# Altium footprint library PCB贴片元件封装库.pcblib: 366 footprints (part 9 of 23)
Each footprint in its own frame and in the unit in brackets; x right, y up, seen from the top. Pads: shape width x height; smd on the part's side, far side on the other; paste and mask are expansions set on the pad; w line width, h text height; cw(c..) or ccw(c..) is an arc to the next point about the centre after c.
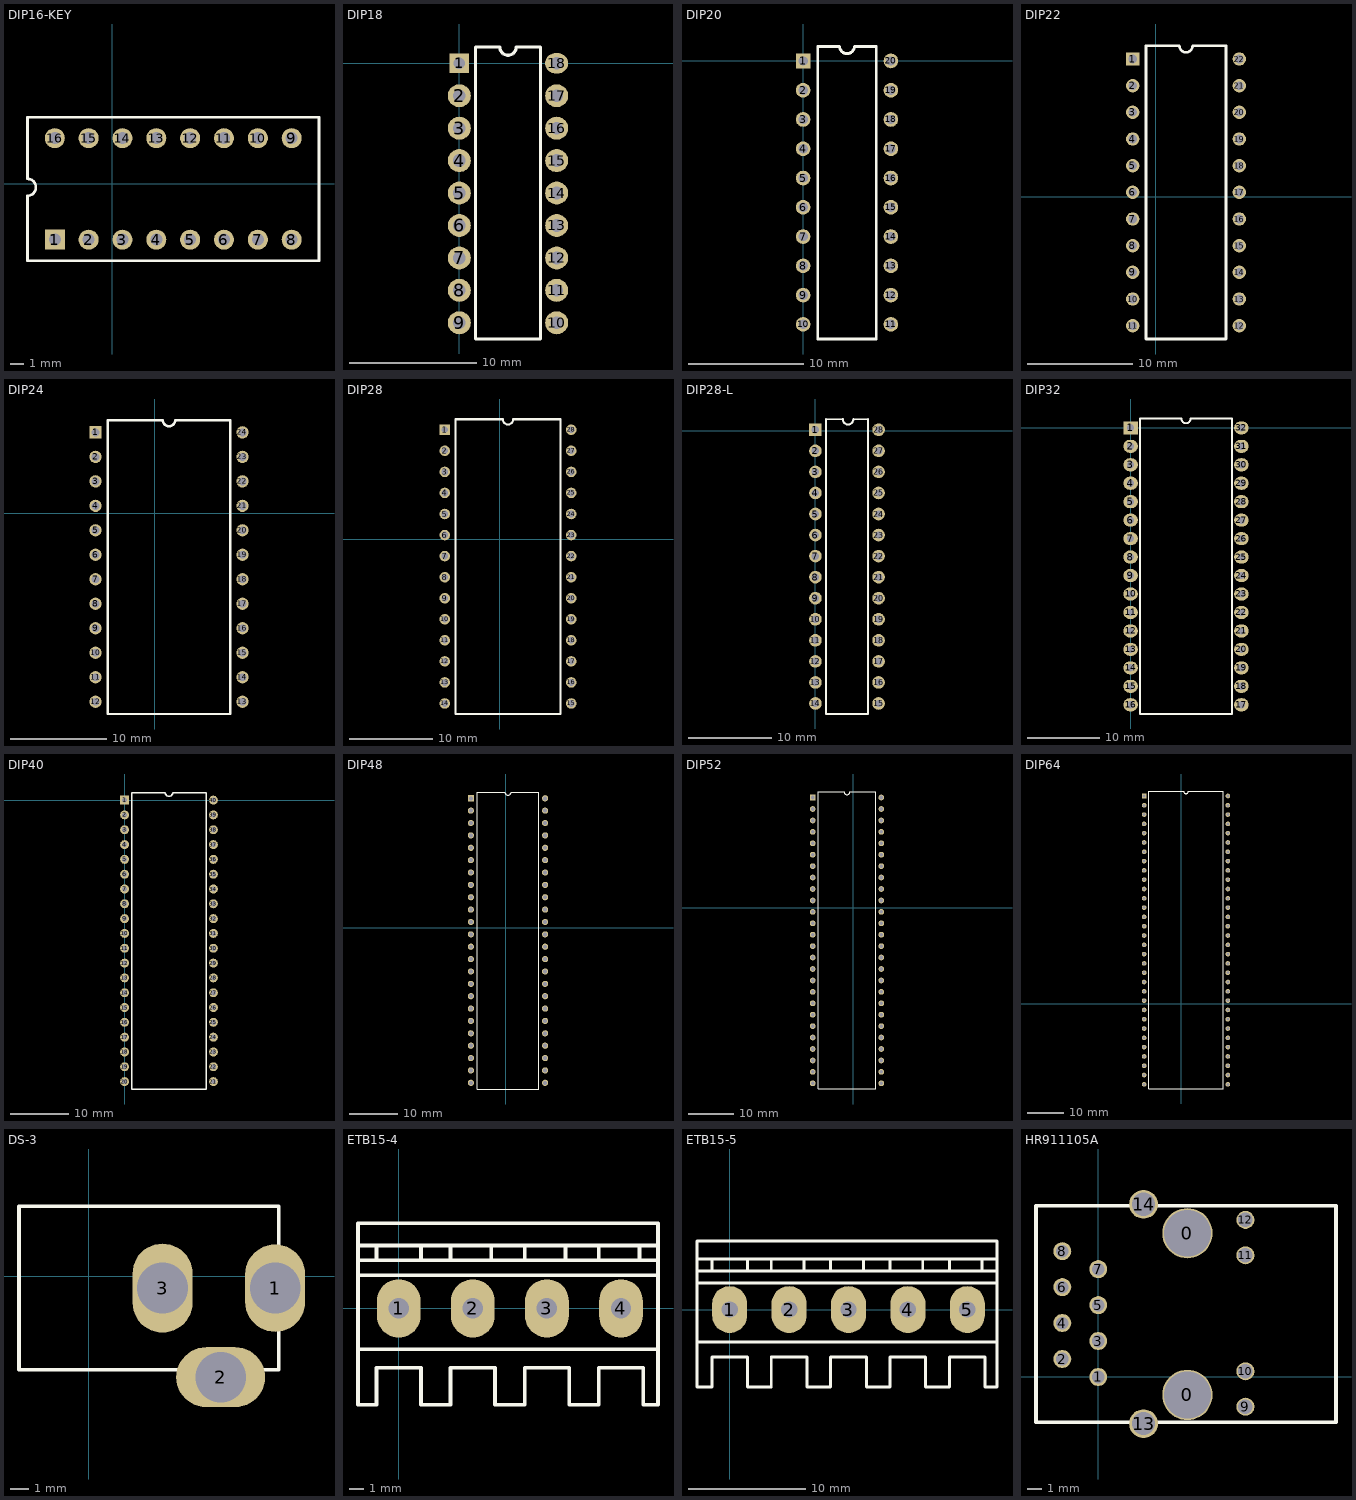
[diagram p8: the footprints below, top view; thin cyan lines are the x and y axes]

## DIP16-KEY [mm]
pads (16):
  rect 1.5x1.5 hole 0.9: 1(-4.318,-4.191)
  round 1.5 hole 0.9: 2(-1.778,-4.191) 3(0.762,-4.191) 4(3.302,-4.191) 5(5.842,-4.191) 6(8.382,-4.191) 7(10.922,-4.191) 8(13.462,-4.191) 9(13.462,3.429) 10(10.922,3.429) 11(8.382,3.429) 12(5.842,3.429) 13(3.302,3.429) 14(0.762,3.429) 15(-1.778,3.429) 16(-4.318,3.429)
TopOverlay:
  lines w0.2: -6.368,0.379 cw(c-6.368,-0.256) -6.368,-0.891 -6.368,-5.781 15.512,-5.781 15.512,5.009 -6.368,5.009 -6.368,0.409

## DIP18 [mm]
pads (18):
  rect 1.524x1.524 hole 0.889: 1(0,0)
  round 1.8 hole 1: 2(0,-2.54) 3(0,-5.08) 4(0,-7.62) 5(0,-10.16) 6(0,-12.7) 7(0,-15.24) 8(0,-17.78) 9(0,-20.32) 10(7.62,-20.32) 11(7.62,-17.78) 12(7.62,-15.24) 13(7.62,-12.7) 14(7.62,-10.16) 15(7.62,-7.62) 16(7.62,-5.08) 17(7.62,-2.54)
  oval 1.8x1.6 hole 1: 18(7.62,0)
TopOverlay:
  lines w0.254: 1.27,-21.59 1.27,1.27 3.175,1.27 ccw(c3.81,1.27) 4.445,1.27 6.35,1.27 6.35,-21.59 1.27,-21.59

## DIP20 [mil]
pads (20):
  rect 50x50 hole 32: 1(0,0)
  round 50 hole 32: 2(0,-100) 3(0,-200) 4(0,-300) 5(0,-400) 6(0,-500) 7(0,-600) 8(0,-700) 9(0,-800) 10(0,-900) 11(300,-900) 12(300,-800) 13(300,-700) 14(300,-600) 15(300,-500) 16(300,-400) 17(300,-300) 18(300,-200) 19(300,-100) 20(300,0)
TopOverlay:
  lines w10: 50,-950 50,50 125,50 ccw(c150,50) 175,50 250,50 250,-950 50,-950

## DIP22 [mil]
pads (22):
  rect 50x50 hole 32: 1(-85.94,517.05)
  round 50 hole 32: 2(-85.94,417.05) 3(-85.94,317.05) 4(-85.94,217.05) 5(-85.94,117.05) 6(-85.94,17.05) 7(-85.94,-82.95) 8(-85.94,-182.95) 9(-85.94,-282.95) 10(-85.94,-382.95) 11(-85.94,-482.95) 12(314.06,-482.95) 13(314.06,-382.95) 14(314.06,-282.95) 15(314.06,-182.95) 16(314.06,-82.95) 17(314.06,17.05) 18(314.06,117.05) 19(314.06,217.05) 20(314.06,317.05) 21(314.06,417.05) 22(314.06,517.05)
TopOverlay:
  lines w10: -35.94,-532.95 -35.94,567.05 89.06,567.05 ccw(c114.06,567.05) 139.06,567.05 264.06,567.05 264.06,-532.95 -35.94,-532.95

## DIP24 [mil]
pads (24):
  rect 50x50 hole 32: 1(-242.52,330.2)
  round 50 hole 32: 2(-242.52,230.2) 3(-242.52,130.2) 4(-242.52,30.2) 5(-242.52,-69.8) 6(-242.52,-169.8) 7(-242.52,-269.8) 8(-242.52,-369.8) 9(-242.52,-469.8) 10(-242.52,-569.8) 11(-242.52,-669.8) 12(-242.52,-769.8) 13(357.48,-769.8) 14(357.48,-669.8) 15(357.48,-569.8) 16(357.48,-469.8) 17(357.48,-369.8) 18(357.48,-269.8) 19(357.48,-169.8) 20(357.48,-69.8) 21(357.48,30.2) 22(357.48,130.2) 23(357.48,230.2) 24(357.48,330.2)
TopOverlay:
  lines w10: -192.52,-819.8 -192.52,380.2 32.48,380.2 ccw(c57.48,380.2) 82.48,380.2 307.48,380.2 307.48,-819.8 -192.52,-819.8

## DIP28 [mil]
pads (28):
  rect 50x50 hole 32: 1(-259.84,520.12)
  round 50 hole 32: 2(-259.84,420.12) 3(-259.84,320.12) 4(-259.84,220.12) 5(-259.84,120.12) 6(-259.84,20.12) 7(-259.84,-79.88) 8(-259.84,-179.88) 9(-259.84,-279.88) 10(-259.84,-379.88) 11(-259.84,-479.88) 12(-259.84,-579.88) 13(-259.84,-679.88) 14(-259.84,-779.88) 15(340.16,-779.88) 16(340.16,-679.88) 17(340.16,-579.88) 18(340.16,-479.88) 19(340.16,-379.88) 20(340.16,-279.88) 21(340.16,-179.88) 22(340.16,-79.88) 23(340.16,20.12) 24(340.16,120.12) 25(340.16,220.12) 26(340.16,320.12) 27(340.16,420.12) 28(340.16,520.12)
TopOverlay:
  lines w10: -209.84,-829.88 -209.84,570.12 15.16,570.12 ccw(c40.16,570.12) 65.16,570.12 290.16,570.12 290.16,-829.88 -209.84,-829.88

## DIP28-L [mil]
pads (28):
  rect 60x60 hole 35: 1(0,5)
  round 60 hole 35: 2(0,-95) 3(0,-195) 4(0,-295) 5(0,-395) 6(0,-495) 7(0,-595) 8(0,-695) 9(0,-795) 10(0,-895) 11(0,-995) 12(0,-1095) 13(0,-1195) 14(0,-1295) 15(300,-1295) 16(300,-1195) 17(300,-1095) 18(300,-995) 19(300,-895) 20(300,-795) 21(300,-695) 22(300,-595) 23(300,-495) 24(300,-395) 25(300,-295) 26(300,-195) 27(300,-95) 28(300,5)
TopOverlay:
  lines w8: 50,-1345 250,-1345 ; 50,55 130,55 ; 180,55 250,55
  lines w10: 50,-1345 50,55 ; 130,55 ccw(c155,55) 180,55 ; 250,-1345 250,55

## DIP32 [mm]
pads (32):
  rect 2x1.8 hole 1: 1(0,0)
  oval 2x1.8 hole 1: 2(0,-2.54) 3(0,-5.08) 4(0,-7.62) 5(0,-10.16) 6(0,-12.7) 7(0,-15.24) 8(0,-17.78) 9(0,-20.32) 10(0,-22.86) 11(0,-25.4) 12(0,-27.94) 13(0,-30.48) 14(0,-33.02) 15(0,-35.56) 16(0,-38.1) 17(15.24,-38.1) 18(15.24,-35.56) 19(15.24,-33.02) 20(15.24,-30.48) 21(15.24,-27.94) 22(15.24,-25.4) 23(15.24,-22.86) 24(15.24,-20.32) 25(15.24,-17.78) 26(15.24,-15.24) 27(15.24,-12.7) 28(15.24,-10.16) 29(15.24,-7.62) 30(15.24,-5.08) 31(15.24,-2.54) 32(15.24,0)
TopOverlay:
  lines w0.254: 1.27,-39.37 13.97,-39.37 13.97,1.27 8.255,1.27 cw(c7.62,1.27) 6.985,1.27 1.27,1.27 1.27,-39.37

## DIP40 [mil]
pads (40):
  rect 60x60 hole 35: 1(0,0)
  round 60 hole 35: 2(0,-100) 3(0,-200) 4(0,-300) 5(0,-400) 6(0,-500) 7(0,-600) 8(0,-700) 9(0,-800) 10(0,-900) 11(0,-1000) 12(0,-1100) 13(0,-1200) 14(0,-1300) 15(0,-1400) 16(0,-1500) 17(0,-1600) 18(0,-1700) 19(0,-1800) 20(0,-1900) 21(600,-1900) 22(600,-1800) 23(600,-1700) 24(600,-1600) 25(600,-1500) 26(600,-1400) 27(600,-1300) 28(600,-1200) 29(600,-1100) 30(600,-1000) 31(600,-900) 32(600,-800) 33(600,-700) 34(600,-600) 35(600,-500) 36(600,-400) 37(600,-300) 38(600,-200) 39(600,-100) 40(600,0)
TopOverlay:
  lines w10: 50,-1950 550,-1950 550,50 325,50 cw(c300,50) 275,50 50,50 50,-1950

## DIP48 [mil]
pads (48):
  rect 50x50 hole 32: 1(-280,1045)
  round 50 hole 32: 2(-280,945) 3(-280,845) 4(-280,745) 5(-280,645) 6(-280,545) 7(-280,445) 8(-280,345) 9(-280,245) 10(-280,145) 11(-280,45) 12(-280,-55) 13(-280,-155) 14(-280,-255) 15(-280,-355) 16(-280,-455) 17(-280,-555) 18(-280,-655) 19(-280,-755) 20(-280,-855) 21(-280,-955) 22(-280,-1055) 23(-280,-1155) 24(-280,-1255) 25(320,-1255) 26(320,-1155) 27(320,-1055) 28(320,-955) 29(320,-855) 30(320,-755) 31(320,-655) 32(320,-555) 33(320,-455) 34(320,-355) 35(320,-255) 36(320,-155) 37(320,-55) 38(320,45) 39(320,145) 40(320,245) 41(320,345) 42(320,445) 43(320,545) 44(320,645) 45(320,745) 46(320,845) 47(320,945) 48(320,1045)
TopOverlay:
  lines w10: -230,-1305 270,-1305 270,1095 45,1095 cw(c20,1095) -5,1095 -230,1095 -230,-1305

## DIP52 [mil]
pads (52):
  rect 50x50 hole 32: 1(-355.04,965.71)
  round 50 hole 32: 2(-355.04,865.71) 3(-355.04,765.71) 4(-355.04,665.71) 5(-355.04,565.71) 6(-355.04,465.71) 7(-355.04,365.71) 8(-355.04,265.71) 9(-355.04,165.71) 10(-355.04,65.71) 11(-355.04,-34.29) 12(-355.04,-134.29) 13(-355.04,-234.29) 14(-355.04,-334.29) 15(-355.04,-434.29) 16(-355.04,-534.29) 17(-355.04,-634.29) 18(-355.04,-734.29) 19(-355.04,-834.29) 20(-355.04,-934.29) 21(-355.04,-1034.29) 22(-355.04,-1134.29) 23(-355.04,-1234.29) 24(-355.04,-1334.29) 25(-355.04,-1434.29) 26(-355.04,-1534.29) 27(244.96,-1534.29) 28(244.96,-1434.29) 29(244.96,-1334.29) 30(244.96,-1234.29) 31(244.96,-1134.29) 32(244.96,-1034.29) 33(244.96,-934.29) 34(244.96,-834.29) 35(244.96,-734.29) 36(244.96,-634.29) 37(244.96,-534.29) 38(244.96,-434.29) 39(244.96,-334.29) 40(244.96,-234.29) 41(244.96,-134.29) 42(244.96,-34.29) 43(244.96,65.71) 44(244.96,165.71) 45(244.96,265.71) 46(244.96,365.71) 47(244.96,465.71) 48(244.96,565.71) 49(244.96,665.71) 50(244.96,765.71) 51(244.96,865.71) 52(244.96,965.71)
TopOverlay:
  lines w10: -305.04,-1584.29 -305.04,1015.71 -80.04,1015.71 ccw(c-55.04,1015.71) -30.04,1015.71 194.96,1015.71 194.96,-1584.29 -305.04,-1584.29

## DIP64 [mil]
pads (64):
  rect 50x50 hole 32: 1(-401.61,2231.61)
  round 50 hole 32: 2(-401.61,2131.61) 3(-401.61,2031.61) 4(-401.61,1931.61) 5(-401.61,1831.61) 6(-401.61,1731.61) 7(-401.61,1631.61) 8(-401.61,1531.61) 9(-401.61,1431.61) 10(-401.61,1331.61) 11(-401.61,1231.61) 12(-401.61,1131.61) 13(-401.61,1031.61) 14(-401.61,931.61) 15(-401.61,831.61) 16(-401.61,731.61) 17(-401.61,631.61) 18(-401.61,531.61) 19(-401.61,431.61) 20(-401.61,331.61) 21(-401.61,231.61) 22(-401.61,131.61) 23(-401.61,31.61) 24(-401.61,-68.39) 25(-401.61,-168.39) 26(-401.61,-268.39) 27(-401.61,-368.39) 28(-401.61,-468.39) 29(-401.61,-568.39) 30(-401.61,-668.39) 31(-401.61,-768.39) 32(-401.61,-868.39) 33(498.39,-868.39) 34(498.39,-768.39) 35(498.39,-668.39) 36(498.39,-568.39) 37(498.39,-468.39) 38(498.39,-368.39) 39(498.39,-268.39) 40(498.39,-168.39) 41(498.39,-68.39) 42(498.39,31.61) 43(498.39,131.61) 44(498.39,231.61) 45(498.39,331.61) 46(498.39,431.61) 47(498.39,531.61) 48(498.39,631.61) 49(498.39,731.61) 50(498.39,831.61) 51(498.39,931.61) 52(498.39,1031.61) 53(498.39,1131.61) 54(498.39,1231.61) 55(498.39,1331.61) 56(498.39,1431.61) 57(498.39,1531.61) 58(498.39,1631.61) 59(498.39,1731.61) 60(498.39,1831.61) 61(498.39,1931.61) 62(498.39,2031.61) 63(498.39,2131.61) 64(498.39,2231.61)
TopOverlay:
  lines w10: -351.61,-918.39 448.39,-918.39 448.39,2281.61 73.39,2281.61 cw(c48.39,2281.61) 23.39,2281.61 -351.61,2281.61 -351.61,-918.39

## DS-3 [mil]
pads (3):
  oval 130x190 hole 110: 1(403.98,-26.22)
  oval 192.91x130 hole 110: 2(285.87,-219.13)
  oval 130x192.91 hole 110: 3(159.88,-26.22)
TopOverlay:
  lines w7.87: -151.14,-203.39 411.85,-203.39 411.85,150.94 -151.14,150.94 -151.14,-203.39

## ETB15-4 [mm]
pads (4):
  oval 3x4 hole 1.4: 1(0,0) 2(5.08,0) 3(10.16,0) 4(15.24,0)
TopOverlay:
  lines w0.254: -2.794,-2.794 7.874,-2.794 ; -2.794,2.286 7.874,2.286 17.78,2.286 ; -2.794,3.302 7.874,3.302 17.78,3.302 ; -2.794,4.318 7.874,4.318 17.78,4.318 ; -1.524,3.302 -1.524,4.318 1.524,4.318 1.524,3.302 3.556,3.302 3.556,4.318 6.35,4.318 6.35,3.302 ; 7.62,-2.794 17.78,-2.794 ; 8.636,3.302 8.636,4.318 ; 11.43,3.302 11.43,4.318 ; 13.716,3.302 13.716,4.318 ; 16.51,3.302 16.51,4.318 ; -2.794,-6.604 -2.794,5.842 7.874,5.842 17.78,5.842 17.78,-6.604 16.764,-6.604 16.764,-4.064 13.716,-4.064 13.716,-6.604 11.684,-6.604 11.684,-4.064 8.636,-4.064 8.636,-6.604 6.604,-6.604 6.604,-4.064 3.556,-4.064 3.556,-6.604 1.524,-6.604 1.524,-4.064 -1.524,-4.064 -1.524,-6.604 -2.794,-6.604

## ETB15-5 [mm]
pads (5):
  oval 3x4 hole 1.4: 1(0,0) 2(5.08,0) 3(10.16,0) 4(15.24,0) 5(20.32,0)
TopOverlay:
  lines w0.254: -2.794,-2.794 7.874,-2.794 22.86,-2.794 ; -2.794,2.286 7.874,2.286 22.86,2.286 ; -2.794,3.302 7.874,3.302 22.86,3.302 ; -2.794,4.318 7.874,4.318 22.86,4.318 ; -1.524,3.302 -1.524,4.318 1.524,4.318 1.524,3.302 3.556,3.302 3.556,4.318 6.35,4.318 6.35,3.302 ; 8.636,3.302 8.636,4.318 ; 11.43,3.302 11.43,4.318 ; 13.716,3.302 13.716,4.318 ; 16.51,3.302 16.51,4.318 ; 18.796,3.302 18.796,4.318 ; 21.59,3.302 21.59,4.318 ; -2.794,-6.604 -1.524,-6.604 -1.524,-4.064 1.524,-4.064 1.524,-6.604 3.556,-6.604 3.556,-4.064 6.604,-4.064 6.604,-6.604 8.636,-6.604 8.636,-4.064 11.684,-4.064 11.684,-6.604 13.716,-6.604 13.716,-4.064 16.764,-4.064 16.764,-6.604 18.796,-6.604 18.796,-4.064 21.844,-4.064 21.844,-6.604 22.86,-6.604 22.86,5.842 7.874,5.842 -2.794,5.842 -2.794,-6.604

## HR911105A [mil]
pads (16):
  round 140 hole 130: 0(248.03,-50) 0(248.03,400)
  round 50 hole 35: 1(0,0) 2(-100,50) 3(0,100) 4(-100,150) 5(0,200) 6(-100,250) 7(0,300) 8(-100,350)
  round 50 hole 40: 9(409.45,-82.68) 10(409.45,15.75) 11(409.45,338.58) 12(409.45,437.01)
  round 80 hole 64: 13(125.98,-129.92)
  round 80 hole 65: 14(125.98,480.31)
TopOverlay:
  lines w10: -173.23,-125.98 -173.23,476.38 661.42,476.38 661.42,-125.98 -173.23,-125.98